# Altium footprint library ICs And Semiconductors SMD.PcbLib: 943 footprints (part 14 of 60) (continued)
## MINI-CIRCUITS_DF782 [mm] "MINI-CIRCUITS DF782 Case, 1.50mm pitch; 4 pin, 2.44mm W X 4.49mm L"
height 1.6
pads (4):
  rect 0.71x1.5 smd: 1(-1.5,-1.915) 2(0,-1.915) 3(1.5,-1.915) 4(0,1.7)
Top Layer:
  region: -0.457,-0.751 -0.953,-0.255 -0.953,2.172 -0.46,2.665 0.46,2.665 0.953,2.172 0.953,-0.255 0.457,-0.751 0.457,-2.665 -0.457,-2.665
Top Overlay:
  lines w0.2: -2.255,-1.295 -2.3,-1.295 -2.3,1.295 -1.353,1.295 ; 1.353,1.295 2.3,1.295 2.3,-1.295 2.255,-1.295
Top Paste:
  region: -0.457,-0.751 -0.953,-0.255 -0.953,2.172 -0.46,2.665 0.46,2.665 0.953,2.172 0.953,-0.255 0.457,-0.751 0.457,-2.665 -0.457,-2.665
Top Solder:
  region: -0.457,-0.751 -0.953,-0.255 -0.953,2.172 -0.46,2.665 0.46,2.665 0.953,2.172 0.953,-0.255 0.457,-0.751 0.457,-2.665 -0.457,-2.665
Mechanical 8:
  lines w0.1: -1.5,-2.915 -1.5,-1.915 ; -1.5,-0.915 -1.5,-1.915 ; -1,0 0,0 ; 0,-2.915 0,-1.915 0,-0.915 ; 0,-1 0,0 ; 0,1 0,0 ; 1,0 0,0 ; 1.5,-2.915 1.5,-1.915 ; 1.5,-0.915 1.5,-1.915 ; 2.5,-1.915 1.5,-1.915 ; -1.5,-1.915 1.5,-1.915 ; -1.5,-1.915 -2.5,-1.915 -1.5,-1.915
Mechanical 14:
  lines w0.1: -1.705,-1.302 -1.705,-2.12 -1.295,-2.12 -1.295,-1.302 ; -0.825,1.295 -0.825,1.745 -0.45,2.12 0.45,2.12 0.825,1.745 0.825,1.295 ; -0.205,-1.302 -0.205,-2.12 0.205,-2.12 0.205,-1.302 ; 1.295,-1.302 1.295,-2.12 1.705,-2.12 1.705,-1.302 ; 2.3,-1.295 -2.3,-1.295 -2.3,1.295 2.3,1.295
  lines w0.2: 2.3,-1.295 2.3,1.295
Mechanical 15:
  lines w0.05: -2.55,-2.915 -2.55,2.915 2.55,2.915 2.55,-2.915 -2.55,-2.915
3D body "MINI-CIRCUITS_DF782.stp": height 1.6, standoff 0, extent -2.3,-2.12 2.3,2.12

## MINI-CIRCUITS_DG983-1 [mm] "MINI-CIRCUITS DG983-1 Case, 0.50mm Pitch, Square; 5 Pin X 5 Pin, 4mm X 4mm Body (w/Thermal Tab 2.21 X 2.21 mm)"
height 0.9
pads (21):
  rect 0.81x0.25 smd: 1(-1.845,1) 2(-1.845,0.5) 3(-1.845,0) 4(-1.845,-0.5) 5(-1.845,-1) 11(1.845,-1) 12(1.845,-0.5) 13(1.845,0) 14(1.845,0.5) 15(1.845,1)
  rect 0.25x0.81 smd: 6(-1,-1.845) 7(-0.5,-1.845) 8(0,-1.845) 9(0.5,-1.845) 10(1,-1.845) 16(1,1.845) 17(0.5,1.845) 18(0,1.845) 19(-0.5,1.845) 20(-1,1.845)
  rect 2.11x2.11 smd: 21(0,0)
Top Overlay:
  circle w0.25: c-2.6,1.95 r0.125
  lines w0.2: -2.063,-1.475 -2.063,-2.064 -1.475,-2.064 ; -2.063,1.475 -2.063,2.064 -1.475,2.064 ; 1.475,-2.064 2.064,-2.064 2.064,-1.475 ; 1.475,2.064 2.064,2.064 2.064,1.475
Mechanical 8:
  lines w0.1: -0.5,0 0,0 ; 0,-0.5 0,0 ; 0,0.5 0,0 ; 0.5,0 0,0 ; -2.25,-1.125 -1.845,-1 -2.25,-0.875 ; -2.25,-1.125 -1.44,-1.125 -1.44,-0.875 -2.25,-0.875 ; -2.25,-1.125 -2.25,-0.875 ; -2.25,-0.625 -1.845,-0.5 -2.25,-0.375 ; -2.25,-0.625 -1.44,-0.625 -1.44,-0.375 -2.25,-0.375 ; -2.25,-0.625 -2.25,-0.375 ; -2.25,-0.125 -1.845,0 -2.25,0.125 ; -2.25,-0.125 -1.44,-0.125 -1.44,0.125 -2.25,0.125 ; -2.25,-0.125 -2.25,0.125 ; -2.25,0.375 -1.845,0.5 -2.25,0.625 ; -2.25,0.375 -1.44,0.375 -1.44,0.625 -2.25,0.625 ; -2.25,0.375 -2.25,0.625 ; -2.25,0.875 -1.845,1 -2.25,1.125 ; -2.25,0.875 -1.44,0.875 -1.44,1.125 -2.25,1.125 ; -2.25,0.875 -2.25,1.125 ; -1.125,-2.25 -1,-1.845 -0.875,-2.25 ; -1.125,-2.25 -1.125,-1.44 -0.875,-1.44 -0.875,-2.25 ; -1.125,-2.25 -0.875,-2.25 ; -1.125,2.25 -1,1.845 -0.875,2.25 ; -1.125,2.25 -1.125,1.44 -0.875,1.44 -0.875,2.25 ; -1.125,2.25 -0.875,2.25 ; -0.625,-2.25 -0.5,-1.845 -0.375,-2.25 ; -0.625,-2.25 -0.625,-1.44 -0.375,-1.44 -0.375,-2.25 ; -0.625,-2.25 -0.375,-2.25 ; -0.625,2.25 -0.5,1.845 -0.375,2.25 ; -0.625,2.25 -0.625,1.44 -0.375,1.44 -0.375,2.25 ; -0.625,2.25 -0.375,2.25 ; -0.125,-2.25 0,-1.845 0.125,-2.25 ; -0.125,-2.25 -0.125,-1.44 0.125,-1.44 0.125,-2.25 ; -0.125,-2.25 0.125,-2.25 ; -0.125,2.25 0,1.845 0.125,2.25 ; -0.125,2.25 -0.125,1.44 0.125,1.44 0.125,2.25 ; -0.125,2.25 0.125,2.25 ; 0.375,-2.25 0.5,-1.845 0.625,-2.25 ; 0.375,-2.25 0.375,-1.44 0.625,-1.44 0.625,-2.25 ; 0.375,-2.25 0.625,-2.25 ; 0.375,2.25 0.5,1.845 0.625,2.25 ; 0.375,2.25 0.375,1.44 0.625,1.44 0.625,2.25 ; 0.375,2.25 0.625,2.25 ; 0.875,-2.25 1,-1.845 1.125,-2.25 ; 0.875,-2.25 0.875,-1.44 1.125,-1.44 1.125,-2.25 ; 0.875,-2.25 1.125,-2.25 ; 0.875,2.25 1,1.845 1.125,2.25 ; 0.875,2.25 0.875,1.44 1.125,1.44 1.125,2.25 ; 0.875,2.25 1.125,2.25 ; 2.25,-1.125 1.845,-1 2.25,-0.875 ; 2.25,-1.125 1.44,-1.125 1.44,-0.875 2.25,-0.875 ; 2.25,-1.125 2.25,-0.875 ; 2.25,-0.625 1.845,-0.5 2.25,-0.375 ; 2.25,-0.625 1.44,-0.625 1.44,-0.375 2.25,-0.375 ; 2.25,-0.625 2.25,-0.375 ; 2.25,-0.125 1.845,0 2.25,0.125 ; 2.25,-0.125 1.44,-0.125 1.44,0.125 2.25,0.125 ; 2.25,-0.125 2.25,0.125 ; 2.25,0.375 1.845,0.5 2.25,0.625 ; 2.25,0.375 1.44,0.375 1.44,0.625 2.25,0.625 ; 2.25,0.375 2.25,0.625 ; 2.25,0.875 1.845,1 2.25,1.125 ; 2.25,0.875 1.44,0.875 1.44,1.125 2.25,1.125 ; 2.25,0.875 2.25,1.125 ; -1.055,-1.055 1.055,-1.055 1.055,1.055 -1.055,1.055 -1.055,-1.055
Mechanical 14:
  lines w0.1: -2.063,1.463 -1.463,2.064 ; -2.063,1.563 -1.563,2.064 ; -2.063,1.663 -1.663,2.064 ; -2.063,1.763 -1.763,2.064 ; -2.063,1.863 -1.863,2.064 ; -2.063,1.964 -1.963,2.064 ; -2.063,-2.064 -2.063,2.064 2.064,2.064 2.064,-2.064 -2.063,-2.064
Mechanical 15:
  lines w0.05: -2.5,-2.5 -2.5,2.5 2.5,2.5 2.5,-2.5 -2.5,-2.5
3D body "MINI-CIRCUITS_DG983-1.stp": height 0.9, standoff 0, extent -2.063,-2.063 2.064,2.064

## MINI-CIRCUITS_DG983-2 [mm] "MINI-CIRCUITS DG983-2 Case, 0.50mm Pitch, Square; 5 Pin X 5 Pin, 4mm X 4mm Body (w/Thermal Tab 2.31 X 2.31mm)"
height 0.85
pads (21):
  rect 0.81x0.25 smd: 1(-1.845,1) 2(-1.845,0.5) 3(-1.845,0) 4(-1.845,-0.5) 5(-1.845,-1) 11(1.845,-1) 12(1.845,-0.5) 13(1.845,0) 14(1.845,0.5) 15(1.845,1)
  rect 0.25x0.81 smd: 6(-1,-1.845) 7(-0.5,-1.845) 8(0,-1.845) 9(0.5,-1.845) 10(1,-1.845) 16(1,1.845) 17(0.5,1.845) 18(0,1.845) 19(-0.5,1.845) 20(-1,1.845)
  rect 2.31x2.31 smd: 21(0,0)
Top Overlay:
  circle w0.25: c-2.2,2.2 r0.125
  lines w0.2: -2,-1.475 -2,-2 -1.475,-2 ; -2,1.475 -2,1.606 ; -2,1.6 -1.6,2 -1.475,2 ; 1.475,-2 2,-2 2,-1.475 ; 1.475,2 2,2 2,1.475
Mechanical 8:
  lines w0.05: -0.5,0 0,0 ; 0,-0.5 0,0 ; 0,0.5 0,0 ; 0.5,0 0,0 ; -2.25,-1.125 -2.25,-0.875 ; -2.25,-1.125 -1.44,-1.125 -1.44,-0.875 -2.25,-0.875 ; -2.25,-1.125 -1.845,-1 -2.25,-0.875 ; -2.25,-0.625 -2.25,-0.375 ; -2.25,-0.625 -1.44,-0.625 -1.44,-0.375 -2.25,-0.375 ; -2.25,-0.625 -1.845,-0.5 -2.25,-0.375 ; -2.25,-0.125 -2.25,0.125 ; -2.25,-0.125 -1.44,-0.125 -1.44,0.125 -2.25,0.125 ; -2.25,-0.125 -1.845,0 -2.25,0.125 ; -2.25,0.375 -2.25,0.625 ; -2.25,0.375 -1.44,0.375 -1.44,0.625 -2.25,0.625 ; -2.25,0.375 -1.845,0.5 -2.25,0.625 ; -2.25,0.875 -2.25,1.125 ; -2.25,0.875 -1.44,0.875 -1.44,1.125 -2.25,1.125 ; -2.25,0.875 -1.845,1 -2.25,1.125 ; -1.125,-2.25 -0.875,-2.25 ; -1.125,-2.25 -1.125,-1.44 -0.875,-1.44 -0.875,-2.25 ; -1.125,-2.25 -1,-1.845 -0.875,-2.25 ; -1.125,2.25 -0.875,2.25 ; -1.125,2.25 -1.125,1.44 -0.875,1.44 -0.875,2.25 ; -1.125,2.25 -1,1.845 -0.875,2.25 ; -0.625,-2.25 -0.375,-2.25 ; -0.625,-2.25 -0.625,-1.44 -0.375,-1.44 -0.375,-2.25 ; -0.625,-2.25 -0.5,-1.845 -0.375,-2.25 ; -0.625,2.25 -0.375,2.25 ; -0.625,2.25 -0.625,1.44 -0.375,1.44 -0.375,2.25 ; -0.625,2.25 -0.5,1.845 -0.375,2.25 ; -0.125,-2.25 0.125,-2.25 ; -0.125,-2.25 -0.125,-1.44 0.125,-1.44 0.125,-2.25 ; -0.125,-2.25 0,-1.845 0.125,-2.25 ; -0.125,2.25 0.125,2.25 ; -0.125,2.25 -0.125,1.44 0.125,1.44 0.125,2.25 ; -0.125,2.25 0,1.845 0.125,2.25 ; 0.375,-2.25 0.625,-2.25 ; 0.375,-2.25 0.375,-1.44 0.625,-1.44 0.625,-2.25 ; 0.375,-2.25 0.5,-1.845 0.625,-2.25 ; 0.375,2.25 0.625,2.25 ; 0.375,2.25 0.375,1.44 0.625,1.44 0.625,2.25 ; 0.375,2.25 0.5,1.845 0.625,2.25 ; 0.875,-2.25 1.125,-2.25 ; 0.875,-2.25 0.875,-1.44 1.125,-1.44 1.125,-2.25 ; 0.875,-2.25 1,-1.845 1.125,-2.25 ; 0.875,2.25 1.125,2.25 ; 0.875,2.25 0.875,1.44 1.125,1.44 1.125,2.25 ; 0.875,2.25 1,1.845 1.125,2.25 ; 2.25,-1.125 2.25,-0.875 ; 2.25,-1.125 1.44,-1.125 1.44,-0.875 2.25,-0.875 ; 2.25,-1.125 1.845,-1 2.25,-0.875 ; 2.25,-0.625 2.25,-0.375 ; 2.25,-0.625 1.44,-0.625 1.44,-0.375 2.25,-0.375 ; 2.25,-0.625 1.845,-0.5 2.25,-0.375 ; 2.25,-0.125 2.25,0.125 ; 2.25,-0.125 1.44,-0.125 1.44,0.125 2.25,0.125 ; 2.25,-0.125 1.845,0 2.25,0.125 ; 2.25,0.375 2.25,0.625 ; 2.25,0.375 1.44,0.375 1.44,0.625 2.25,0.625 ; 2.25,0.375 1.845,0.5 2.25,0.625 ; 2.25,0.875 2.25,1.125 ; 2.25,0.875 1.44,0.875 1.44,1.125 2.25,1.125 ; 2.25,0.875 1.845,1 2.25,1.125 ; -1.155,-1.155 1.155,-1.155 1.155,1.155 -1.155,1.155 -1.155,-1.155
Mechanical 14:
  lines w0.1: -2,1.4 -1.4,2 ; -2,1.5 -1.5,2 ; -2,1.6 -1.6,2 ; -2,1.7 -1.7,2 ; -2,1.8 -1.8,2 ; -2,1.9 -1.9,2 ; -2,-2 2,-2 2,2 -2,2 -2,-2
Mechanical 15:
  lines w0.05: -2.5,-2.5 2.5,-2.5 2.5,2.5 -2.5,2.5 -2.5,-2.5
3D body "MINI-CIRCUITS_DG983-2.stp": height 0.85, standoff 0, extent -2,-2 2,2

## MINI-CIRCUITS_DG1293 [mm] "MINI-CIRCUITS DG1293 Case, 0.65mm Pitch, Square; 4 Pin X 4 Pin, 4mm X 4mm Body (w/Thermal Tab 2.34 X 2.34mm)"
height 1.2
pads (17):
  rect 0.8x0.3 smd: 1(-1.75,0.975) 2(-1.75,0.325) 3(-1.75,-0.325) 4(-1.75,-0.975) 9(1.75,-0.975) 10(1.75,-0.325) 11(1.75,0.325) 12(1.75,0.975)
  rect 0.3x0.8 smd: 5(-0.975,-1.75) 6(-0.325,-1.75) 7(0.325,-1.75) 8(0.975,-1.75) 13(0.975,1.75) 14(0.325,1.75) 15(-0.325,1.75) 16(-0.975,1.75)
  rect 0.5x0.5 smd paste-0.25 mask-0.25: 17(0,0)
Top Layer:
  region: -1.17,-1.17 1.17,-1.17 1.17,1.17 -0.92,1.17 -1.17,0.92
Top Overlay:
  circle w0.25: c-2.2,2.2 r0.125
  lines w0.2: -2.055,-1.475 -2.055,-2.055 -1.475,-2.055 ; -2.055,1.475 -2.055,1.674 -1.674,2.055 -1.475,2.055 ; 1.475,-2.055 2.055,-2.055 2.055,-1.475 ; 1.475,2.055 2.055,2.055 2.055,1.475
Mechanical 8:
  lines w0.05: -0.5,0 0,0 ; 0,-0.5 0,0 ; 0,0.5 0,0 ; 0.5,0 0,0 ; -2.15,-1.125 -1.75,-0.975 -2.15,-0.825 ; -2.15,-1.125 -2.15,-0.825 ; -2.15,-1.125 -1.35,-1.125 -1.35,-0.825 -2.15,-0.825 ; -2.15,-0.475 -1.75,-0.325 -2.15,-0.175 ; -2.15,-0.475 -2.15,-0.175 ; -2.15,-0.475 -1.35,-0.475 -1.35,-0.175 -2.15,-0.175 ; -2.15,0.175 -1.75,0.325 -2.15,0.475 ; -2.15,0.175 -2.15,0.475 ; -2.15,0.175 -1.35,0.175 -1.35,0.475 -2.15,0.475 ; -2.15,0.825 -1.75,0.975 -2.15,1.125 ; -2.15,0.825 -2.15,1.125 ; -2.15,0.825 -1.35,0.825 -1.35,1.125 -2.15,1.125 ; -1.125,-2.15 -0.975,-1.75 -0.825,-2.15 ; -1.125,-2.15 -1.125,-1.35 -0.825,-1.35 -0.825,-2.15 ; -1.125,-2.15 -0.825,-2.15 ; -1.125,2.15 -0.975,1.75 -0.825,2.15 ; -1.125,2.15 -1.125,1.35 -0.825,1.35 -0.825,2.15 ; -1.125,2.15 -0.825,2.15 ; -0.475,-2.15 -0.325,-1.75 -0.175,-2.15 ; -0.475,-2.15 -0.475,-1.35 -0.175,-1.35 -0.175,-2.15 ; -0.475,-2.15 -0.175,-2.15 ; -0.475,2.15 -0.325,1.75 -0.175,2.15 ; -0.475,2.15 -0.475,1.35 -0.175,1.35 -0.175,2.15 ; -0.475,2.15 -0.175,2.15 ; 0.175,-2.15 0.325,-1.75 0.475,-2.15 ; 0.175,-2.15 0.175,-1.35 0.475,-1.35 0.475,-2.15 ; 0.175,-2.15 0.475,-2.15 ; 0.175,2.15 0.325,1.75 0.475,2.15 ; 0.175,2.15 0.175,1.35 0.475,1.35 0.475,2.15 ; 0.175,2.15 0.475,2.15 ; 0.825,-2.15 0.975,-1.75 1.125,-2.15 ; 0.825,-2.15 0.825,-1.35 1.125,-1.35 1.125,-2.15 ; 0.825,-2.15 1.125,-2.15 ; 0.825,2.15 0.975,1.75 1.125,2.15 ; 0.825,2.15 0.825,1.35 1.125,1.35 1.125,2.15 ; 0.825,2.15 1.125,2.15 ; 2.15,-1.125 1.75,-0.975 2.15,-0.825 ; 2.15,-1.125 2.15,-0.825 ; 2.15,-1.125 1.35,-1.125 1.35,-0.825 2.15,-0.825 ; 2.15,-0.475 1.75,-0.325 2.15,-0.175 ; 2.15,-0.475 2.15,-0.175 ; 2.15,-0.475 1.35,-0.475 1.35,-0.175 2.15,-0.175 ; 2.15,0.175 1.75,0.325 2.15,0.475 ; 2.15,0.175 2.15,0.475 ; 2.15,0.175 1.35,0.175 1.35,0.475 2.15,0.475 ; 2.15,0.825 1.75,0.975 2.15,1.125 ; 2.15,0.825 2.15,1.125 ; 2.15,0.825 1.35,0.825 1.35,1.125 2.15,1.125 ; -1.17,-1.17 -1.17,0.92 -0.92,1.17 1.17,1.17 1.17,-1.17 -1.17,-1.17
Mechanical 14:
  lines w0.1: -2.055,1.455 -1.455,2.055 ; -2.055,1.555 -1.555,2.055 ; -2.055,1.655 -1.655,2.055 ; -2.055,1.755 -1.755,2.055 ; -2.055,1.855 -1.855,2.055 ; -2.055,1.955 -1.955,2.055 ; -2.055,-2.055 -2.055,2.055 2.055,2.055 2.055,-2.055 -2.055,-2.055
Mechanical 15:
  lines w0.05: -2.4,-2.4 2.4,-2.4 2.4,2.4 -2.4,2.4 -2.4,-2.4
3D body "MINI-CIRCUITS_DG1293.stp": height 1.2, standoff 0, extent -2.055,-2.055 2.055,2.055

## MINI-CIRCUITS_DQ849 [mm] "MINI-CIRCUITS DQ849 Case, 0.66mm pitch, 8 pin, 3mm X 3mm X 0.99mm H body (w/thermal tab 1.7 X 1.7mm)"
height 0.99
pads (9):
  rect 0.79x0.3 smd: 1(-1.485,0.33) 2(-1.485,-0.33) 5(1.485,-0.33) 6(1.485,0.33)
  rect 0.3x0.79 smd: 3(-0.33,-1.485) 4(0.33,-1.485) 7(0.33,1.485) 8(-0.33,1.485)
  rect 1.7x1.7 smd: 9(0,0)
Top Overlay:
  circle w0.25: c-1.8,1.775 r0.125
  lines w0.2: -1.5,-0.78 -1.5,-1.5 -0.78,-1.5 ; -1.5,0.78 -1.5,1.2 ; -0.78,1.5 -1.2,1.5 ; 0.78,-1.5 1.5,-1.5 1.5,-0.78 ; 0.78,1.5 1.5,1.5 1.5,0.78 ; -1.5,1.2 -1.2,1.5 ; -1.5,1.2 -1.2,1.5
Mechanical 8:
  lines w0.1: -0.5,0 0,0 ; 0,-0.5 0,0 ; 0,0.5 0,0 ; 0.5,0 0,0 ; -1.88,-0.48 -1.485,-0.33 -1.88,-0.18 ; -1.88,-0.48 -1.88,-0.18 ; -1.88,-0.48 -1.09,-0.48 -1.09,-0.18 -1.88,-0.18 ; -1.88,0.18 -1.485,0.33 -1.88,0.48 ; -1.88,0.18 -1.88,0.48 ; -1.88,0.18 -1.09,0.18 -1.09,0.48 -1.88,0.48 ; -0.48,-1.88 -0.33,-1.485 -0.18,-1.88 ; -0.48,-1.88 -0.18,-1.88 ; -0.48,-1.88 -0.48,-1.09 -0.18,-1.09 -0.18,-1.88 ; -0.48,1.88 -0.33,1.485 -0.18,1.88 ; -0.48,1.88 -0.18,1.88 ; -0.48,1.88 -0.48,1.09 -0.18,1.09 -0.18,1.88 ; 0.18,-1.88 0.33,-1.485 0.48,-1.88 ; 0.18,-1.88 0.48,-1.88 ; 0.18,-1.88 0.18,-1.09 0.48,-1.09 0.48,-1.88 ; 0.18,1.88 0.33,1.485 0.48,1.88 ; 0.18,1.88 0.48,1.88 ; 0.18,1.88 0.18,1.09 0.48,1.09 0.48,1.88 ; 1.88,-0.48 1.485,-0.33 1.88,-0.18 ; 1.88,-0.48 1.88,-0.18 ; 1.88,-0.48 1.09,-0.48 1.09,-0.18 1.88,-0.18 ; 1.88,0.18 1.485,0.33 1.88,0.48 ; 1.88,0.18 1.88,0.48 ; 1.88,0.18 1.09,0.18 1.09,0.48 1.88,0.48 ; -0.85,-0.85 0.85,-0.85 0.85,0.85 -0.85,0.85 -0.85,-0.85
Mechanical 14:
  lines w0.1: -1.5,1.1 -1.1,1.5 ; -1.5,1.3 -1.3,1.5 ; -1.5,1.4 -1.4,1.5 ; -1.5,-1.5 -1.5,1.5 1.5,1.5 1.5,-1.5 -1.5,-1.5 ; -1.5,1.2 -1.2,1.5 -1.5,1.2
Mechanical 15:
  lines w0.05: -2.13,-2.13 -2.13,2.13 2.13,2.13 2.13,-2.13 -2.13,-2.13
3D body "MINI-CIRCUITS_DQ849.stp": height 0.99, standoff 0, extent -1.5,-1.5 1.5,1.5

## MINI-CIRCUITS_DV874 [mm] "MINI-CIRCUITS DV874 Case, 2.54mm pitch; 16 pins, Square Body 12.7mm W X 12.7mm L X 4.95mm H"
height 4.95
pads (16):
  rect 1.52x1.52 smd: 1(-6.1,3.43) 3(-6.1,-1.65) 4(-6.1,-4.19) 5(-3.43,-6.1) 7(1.65,-6.1) 8(4.19,-6.1) 9(6.1,-3.3) 11(6.1,1.78) 12(6.1,4.32) 13(4.19,6.1) 15(-0.89,6.1) 16(-3.43,6.1)
  rect 1.651x1.52 smd: 2(-6.034,0.89) 10(6.034,-0.76)
  rect 1.52x1.651 smd: 6(-0.89,-6.034) 14(1.65,6.034)
Top Layer:
  region: -6.35,6.35 -6.35,2.67 -4.322,2.67 -4.32,2.668 -4.32,-0.888 -6.35,-0.888 -6.35,-6.35 -2.668,-6.35 -2.668,-4.32 0.89,-4.32 0.89,-6.35 6.35,-6.35 6.35,-2.54 4.322,-2.54 4.32,-2.538 4.32,1.018 6.348,1.018 6.35,1.02 6.35,6.35 3.428,6.35 3.428,4.32 -0.128,4.32 -0.13,4.322 -0.13,6.35
Top Overlay:
  circle w0.25: c-7.4,3.475 r0.125
  lines w0.2: -6.65,-5.35 -6.65,-6.65 -4.59,-6.65 ; -6.65,4.59 -6.65,6.65 -4.59,6.65 ; 5.35,-6.65 6.65,-6.65 6.65,-4.46 ; 5.35,6.65 6.65,6.65 6.65,5.48
Mechanical 8:
  drawing of 152 lines, arcs and shapes, not listed
Mechanical 14:
  circle w0.1: c-4.28,4.28 r0.5
  lines w0.1: -6.35,-6.35 -3.95,-6.35 cw(c-3.43,-6.65) -2.91,-6.35 -1.41,-6.35 cw(c-0.89,-6.65) -0.37,-6.35 1.13,-6.35 cw(c1.65,-6.65) 2.17,-6.35 3.67,-6.35 cw(c4.19,-6.65) 4.71,-6.35 6.35,-6.35 6.35,-3.82 cw(c6.65,-3.3) 6.35,-2.78 6.35,-1.28 cw(c6.65,-0.76) 6.35,-0.24 6.35,1.26 cw(c6.65,1.78) 6.35,2.3 6.35,3.8 cw(c6.65,4.32) 6.35,4.84 6.35,6.35 4.71,6.35 cw(c4.19,6.65) 3.67,6.35 2.17,6.35 cw(c1.65,6.65) 1.13,6.35 -0.37,6.35 cw(c-0.89,6.65) -1.41,6.35 -2.91,6.35 cw(c-3.43,6.65) -3.95,6.35 -6.35,6.35 -6.35,3.95 cw(c-6.65,3.43) -6.35,2.91 -6.35,1.41 cw(c-6.65,0.89) -6.35,0.37 -6.35,-1.13 cw(c-6.65,-1.65) -6.35,-2.17 -6.35,-3.67 cw(c-6.65,-4.19) -6.35,-4.71 -6.35,-6.35 ; -5.58,-5.28 ccw(c-5.28,-5.28) -5.28,-5.58 5.28,-5.58 ccw(c5.28,-5.28) 5.58,-5.28 5.58,5.28 ccw(c5.28,5.28) 5.28,5.58 -5.28,5.58 ccw(c-5.28,5.28) -5.58,5.28 -5.58,-5.28
Mechanical 15:
  lines w0.05: -7.11,-7.11 -7.11,7.11 7.11,7.11 7.11,-7.11 -7.11,-7.11
3D body "MINI-CIRCUITS_DV874.stp": height 4.95, standoff 0, extent -6.35,-6.35 6.35,6.35

## MINI-CIRCUITS_DZ943 [mm] "MINI-CIRCUITS TDZ943 Case, 10 pin,  7.62mm W X 6.35mm L"
height 5.83
pads (10):
  rect 2.16x0.76 smd: 1(-2.73,2.54) 2(-2.73,1.27) 3(-2.73,0) 4(-2.73,-1.27) 5(-2.73,-2.54) 6(2.73,-2.54) 7(2.73,-1.27) 8(2.73,0) 9(2.73,1.27) 10(2.73,2.54)
Top Overlay:
  circle w0.25: c-4.3,2.54 r0.125
  lines w0.2: -3.175,-3.32 -3.175,-3.81 3.175,-3.81 3.175,-3.32 ; -3.175,3.32 -3.175,3.81 3.175,3.81 3.175,3.32
Mechanical 8:
  lines w0.1: -3.73,-2.54 -2.73,-2.54 ; -3.73,-1.27 -2.73,-1.27 -1.73,-1.27 ; -3.73,0 -2.73,0 -1.73,0 ; -3.73,1.27 -2.73,1.27 -1.73,1.27 ; -3.73,2.54 -2.73,2.54 ; -1.73,-2.54 -2.73,-2.54 ; -1.73,2.54 -2.73,2.54 ; -1,0 0,0 ; 0,-1 0,0 ; 0,1 0,0 ; 1,0 0,0 ; 1.73,-2.54 2.73,-2.54 ; 1.73,-1.27 2.73,-1.27 3.73,-1.27 ; 1.73,0 2.73,0 3.73,0 ; 1.73,1.27 2.73,1.27 3.73,1.27 ; 1.73,2.54 2.73,2.54 ; 3.73,-2.54 2.73,-2.54 ; 3.73,2.54 2.73,2.54 ; -2.73,-2.54 -2.73,2.54 ; 2.73,-2.54 2.73,2.54
Mechanical 14:
  circle w0.1: c-1.805,2.44 r0.4
  lines w0.1: -3.175,-2.69 -3.38,-2.69 -3.38,-2.39 -3.175,-2.39 ; -3.175,-1.42 -3.38,-1.42 -3.38,-1.12 -3.175,-1.12 ; -3.175,-0.15 -3.38,-0.15 -3.38,0.15 -3.175,0.15 ; -3.175,1.12 -3.38,1.12 -3.38,1.42 -3.175,1.42 ; -3.175,2.39 -3.38,2.39 -3.38,2.69 -3.175,2.69 ; 3.175,-2.69 3.38,-2.69 3.38,-2.39 3.175,-2.39 ; 3.175,-1.42 3.38,-1.42 3.38,-1.12 3.175,-1.12 ; 3.175,-0.15 3.38,-0.15 3.38,0.15 3.175,0.15 ; 3.175,1.12 3.38,1.12 3.38,1.42 3.175,1.42 ; 3.175,2.39 3.38,2.39 3.38,2.69 3.175,2.69 ; -3.175,-3.81 3.175,-3.81 3.175,3.81 -3.175,3.81 -3.175,-3.81 ; -2.805,-3.44 2.805,-3.44 2.805,3.44 -2.805,3.44 -2.805,-3.44
Mechanical 15:
  lines w0.05: -4.06,-4.06 4.06,-4.06 4.06,4.06 -4.06,4.06 -4.06,-4.06
3D body "MINI-CIRCUITS_DZ943.stp": height 4.83, standoff 0, extent -3.38,-3.81 3.38,3.81

## MINI-CIRCUITS_FG873 [mm] "MINI-CIRCUITS FG873 Case, 4 pin, 3.0mm W X 3.0mm L"
height 0.89
pads (4):
  rect 1.55x0.61 smd: 1(-1.585,0) 3(1.585,0)
  rect 0.61x1.55 smd: 2(0,-1.585) 4(0,1.585)
Top Layer:
  region: -0.305,2.36 -0.305,-2.36 0.305,-2.36 0.305,2.36
Top Overlay:
  circle w0.25: c-2.05,-0.95 r0.125
  lines w0.2: -1.487,-0.705 -0.705,-1.487 ; -1.487,0.705 -0.705,1.487 ; 0.705,-1.487 1.487,-0.705 ; 0.705,1.487 1.487,0.705
Mechanical 8:
  lines w0.1: -2.085,0 -1.585,0 ; -1.585,-0.5 -1.585,0 ; -1.585,0.5 -1.585,0 ; -1.085,0 -1.585,0 ; -0.5,-1.585 0,-1.585 ; -0.5,0 0,0 ; -0.5,1.585 0,1.585 ; 0,-2.085 0,-1.585 ; 0,-1.085 0,-1.585 ; 0,-0.5 0,0 ; 0,0.5 0,0 ; 0,1.085 0,1.585 ; 0,2.085 0,1.585 ; 0.5,-1.585 0,-1.585 ; 0.5,0 0,0 ; 0.5,1.585 0,1.585 ; 1.085,0 1.585,0 ; 1.585,-0.5 1.585,0 ; 1.585,0.5 1.585,0 ; 2.085,0 1.585,0 ; -2.36,-0.305 -2.36,0.305 -0.81,0.305 -0.81,-0.305 -2.36,-0.305 ; -0.305,-2.36 0.305,-2.36 0.305,-0.81 -0.305,-0.81 -0.305,-2.36 ; -0.305,0.81 0.305,0.81 0.305,2.36 -0.305,2.36 -0.305,0.81 ; 0.81,-0.305 0.81,0.305 2.36,0.305 2.36,-0.305 0.81,-0.305
Mechanical 14:
  lines w0.1: -2.192,0 0,-2.192 2.192,0 0,2.192 -2.192,0
Mechanical 15:
  lines w0.05: -2.537,-0.482 -0.482,-2.537 0.482,-2.537 2.537,-0.482 2.537,0.482 0.482,2.537 -0.482,2.537 -2.537,0.482 -2.537,-0.482
3D body "MINI-CIRCUITS_FG873.stp": height 0.89, standoff 0, extent -2.171,-2.171 2.171,2.171

## MINI-CIRCUITS_GP731 [mil] "MINI-CIRCUITS GP731 Case, 8 Pin, 8.89mm W X 8.89mm L"
height 100
pads (8):
  rect 70x40 smd: 1(-160,75) 2(-160,0) 3(-160,-75) 5(160,-75) 6(160,0) 7(160,75)
  rect 40x70 smd: 4(0,-160.04) 8(0,160)
Top Layer:
  region: -195,-195 -195,-95 -125,-95 -125,-55 -95,-55 -95,55 -125,55 -125,95 -195,95 -195,171.14 -171.14,195 -55,195 -55,95 55,95 55,195 195,195 195,95 125,95 125,55 95,55 95,-55 125,-55 125,-95 195,-95 195,-195 55,-195 55,-95 -55,-95 -55,-195
Top Overlay:
  circle w3.94: c-139.57,135.63 r11.81
  circle w9.84: c-202.03,139.76 r4.92
  lines w7.87: -175,-111.81 -175,-175 -54.92,-175 ; -175,111.81 -175,175 -54.92,175 ; 54.92,-175 175,-175 175,-111.81 ; 54.92,175 175,175 175,111.81
Mechanical 8:
  lines w3.94: -179.69,-75 -160,-75 ; -179.69,0 -160,0 ; -179.69,75 -160,75 ; -160,-94.69 -160,-75 ; -160,-55.31 -160,-75 ; -160,-19.69 -160,0 ; -160,19.69 -160,0 ; -160,55.31 -160,75 ; -160,94.69 -160,75 ; -140.31,-75 -160,-75 ; -140.31,0 -160,0 ; -140.31,75 -160,75 ; -19.68,-160 0,-160 ; -19.69,0 0,0 ; -19.68,160 0,160 ; 0,-179.69 0,-160 ; 0,-140.31 0,-160 ; 0,-19.69 0,0 ; 0,19.69 0,0 ; 0,140.31 0,160 ; 0,179.69 0,160 ; 19.69,-160 0,-160 ; 19.69,0 0,0 ; 19.69,160 0,160 ; 140.31,-75 160,-75 ; 140.31,0 160,0 ; 140.31,75 160,75 ; 160,-94.69 160,-75 ; 160,-55.31 160,-75 ; 160,-19.69 160,0 ; 160,19.68 160,0 ; 160,55.31 160,75 ; 160,94.69 160,75 ; 179.69,-75 160,-75 ; 179.69,0 160,0 ; 179.69,75 160,75 ; -195,-95 -125,-95 ; -195,-95 -195,-195 -55,-195 -55,-95 55,-95 55,-195 195,-195 195,-95 ; -195,-95 -195,-55 -125,-55 ; -195,-95 -125,-95 ; -195,95 -195,195 -55,195 -55,95 55,95 55,195 195,195 195,95 ; -195,95 -125,95 ; -195,95 -195,55 -125,55 ; -195,95 -125,95 ; -125,-95 -125,-55 ; -125,-95 -125,-55 ; -125,-55 -95,-55 -95,55 -125,55 ; -125,55 -125,95 ; -125,55 -125,95 ; 125,-95 125,-55 ; 125,-95 195,-95 ; 125,-95 125,-55 ; 125,-95 195,-95 ; 125,-55 95,-55 95,55 125,55 ; 125,-55 195,-55 195,-95 ; 125,55 125,95 ; 125,55 125,95 ; 125,55 195,55 195,95 ; 125,95 195,95 ; 125,95 195,95 ; -195,-20 -195,20 -125,20 -125,-20 -195,-20 ; -20,-195 20,-195 20,-125 -20,-125 -20,-195 ; -20,125 20,125 20,195 -20,195 -20,125 ; 125,-20 125,20 195,20 195,-20 125,-20
Mechanical 14:
  circle w3.94: c-139.57,135.63 r11.81
  lines w3.94: -175,-175 -175,175 175,175 175,-175 -175,-175
Mechanical 15:
  lines w1.97: -204.84,-204.84 -204.84,204.84 204.84,204.84 204.84,-204.84 -204.84,-204.84
3D body "MINI-CIRCUITS_GP731.stp": height 100, standoff 0, extent -175,-175 175,175